# Altium integrated library CbyP.IntLib: 1144 symbols (part 6 of 6) (continued)
## FL7760BM6X (continued)

## HT7533-1
designator IC?
LDO high voltage regulator; Manufacturer: UMW; Mfr.Part #: HT7533-1; Package: SOT-89; LCSC Part #: C347186
footprint SOT-89
pins: 1 GND, 2 IN, 3 OUT

## IP2312-4V35
designator IC?, comment IP2312
Single-cell lithium battery synchronous switching step-down charging IC; Manufacturer: INJOINIC; Mfr.Part #: IP2312-4V35; Package: ESOP-8; LCSC Part #: C605433
footprint ESOP-8
pins: 1 D1, 2 TEST, 3 D2, 4 NTC, 5 BAT, 6 ICHG, 7 SW, 8 VIN, 9 GND

## IP2326
designator IC?, comment IP2366
2~3 1.5A VQFN-24-EP(4x4) Battery Management RoHS; Manufacturer: INJOINIC; Mfr.Part #: IP2326; Package: VQFN-24-EP(4x4); LCSC Part #: C2832094; DigiKey Part Number: NO
footprint QFN-24-EP(4x4)
pins: 1 DN, 2 DP, 3 VSET, 4 NTC, 5 BAT-STAT, 6 LED, 7 TIME-SET, 8 VIN-UVSET, 9 VIN-OVSET, 10 CON-SEL, 11 ISET, 12 EN, 13 VIN, 14 BST, 15 LX, 16 LX, 17 LX, 18 PGND, 19 VSYS, 20 VSYS, 21 VOUT, 22 VOUT, 23 VBATM, 24 VBATGND, 25 EP

## IP2366 (I2C version)
designator IC?, comment IP2366
QFN-40(5x5) Power Management - Specialized ROHS; Manufacturer: INJOINIC; Mfr.Part #: IP2366 (I2C version); So_Chan_Dan: 40; So_Chan_Cam: 0; Package: QFN-40(5x5); Name: IP2366
footprint QFN-40(5x5)
pins: 1 TEST2, 2 TEST3, 3 TEST4, 4 TEST5, 5 VBUS, 6 VBUSG, 7 VBUSI, 8 VIO, 9 CSP1, 10 CSN1, 11 PCIN, 12 HG1, 13 BST1, 14 LX1, 15 LG1, 16 LG2, 17 LX2, 18 BST2, 19 HG2, 20 PCON, 21 CSN2, 22 CSP2, 23 BAT, 24 CC_BDO, 25 VCC5V, 26 AGND, 27 GPIO4, 28 VCCIO, 29 GPIO3, 30 GPIO2, 31 GPIO1, 32 GPIO0, 33 EN, 34 CC2, 35 DPC, 36 DMC, 37 CC1, 38 GPIO19, 39 GPIO20, 40 TEST1, 41 GND

## IP2368_BZ_VGLIP
designator IC?, comment IP2368
Power management chip that supports multiple fast charging input and output protocols, multiple series-connected battery cells, and integrates step-up/step-down drivers.; Manufacturer: INJOINIC; Mfr.Part #: IP2368_BZ_VGLIP; Package: QFN-48(7x7); LCSC Part #: C5203723; DigiKey Part Number: NO; ComponentLink1Description: Link; ComponentLink1URL: https://www.lcsc.com/product-detail/C5203723.html?s_z=n_IP2368&spm=wm.ssy.bg.0.xh&lcsc_vid=RlMKBl1fQlJdAlBTQgUIUgUHQFUPBlJQFlJXVl0AT1cxVlNRQ1NdX1VXQFVaVjsOAxUeFF5JWBYZEEoKFBINSQcJGk4%3D; ComponentLink2Description: Link 1
footprint QFN-48-EP(7x7)-(IP2326)
pins: 1 NC, 2 LT, 3 NC, 4 LED3/I2C_INT, 5 HLED, 6 NC, 7 NC, 8 VBUS, 9 VBUSG, 10 VBUS_I, 11 AGND, 12 VIO, 13 CSP1, 14 CSN1, 15 PCIN, 16 HG1, 17 BST1, 18 LX1, 19 LG1, 20 LG2, 21 LX2, 22 BST2, 23 HG2, 24 PCON, 25 CSN2, 26 CSP2, 27 BAT, 28 LX, 29 VCC5V, 30 AGND, 31 NC, 32 VCCIO, 33 BAT_NUM, 34 FCAP, 35 VSET, 36 ISET, 37 NTC, 38 CC2, 39 DPC, 40 DMC, 41 CC1, 42 LED2/IIC_SDA, 43 LED1/IIC_SCL, 44 NC, 45 NC, 46 BAT_MODE, 47 ISET_MODE, 48 NC, 49 EPAD

## L7805ABD2T-TR
designator IC?
68dB@(120Hz) 1.5A Fixed 5V Positive electrode 35V TO-263-2 Voltage Regulators - Linear, Low Drop Out (LDO) Regulators ROHS; Manufacturer: STMicroelectronics; So_Chan_Dan: 3; So_Chan_Cam: 0; Mfr.Part #: L7805ABD2T-TR; Package: TO-263; Name: L7805ABD2T-TR
footprint TO-263
pins: 1 IN, 2 GND, 3 OUT

## L7805CV
designator IC?
Positive Voltage Regulator IC; Manufacturer: ST; Mfr.Part #: L7805CV; Package: TO-220; LCSC Part #: C111887
footprint TO-220
pins: 1 IN, 2 GND, 3 OUT

## LM1084ISX-3.3/NOPB
designator IC?
Linear Voltage Regulator IC Positive Fixed 1 Output 5A TO-263-3; Manufacturer: TI; Mfr.Part #: LM1084ISX-3.3/NOPB; Package: TO-263-3; LCSC Part #: C2860175; DigiKey Part Number: 296-35390-2-ND; ComponentLink1Description: Link 1; ComponentLink1URL: https://www.digikey.com/en/products/detail/texas-instruments/LM1084ISX-3-3-NOPB/366706; ComponentLink2Description: Link; ComponentLink2URL: https://www.lcsc.com/product-detail/C2860175.html?s_z=n_LM1084ISX-3.3%252FNOPB
footprint TO-263-3
pins: 1 ADJ/GND, 2 OUT, 3 VIN

## LM1084R-3.3
designator IC?
12V Positive Fixed 3.3V TO-263-3 Voltage Regulators - Linear, Low Drop Out (LDO) Regulators RoHS; Manufacturer: HTC; Mfr.Part #: LM1084R-3.3; Package: TO-263-3; LCSC Part #: C262795; DigiKey Part Number: NO; ComponentLink1Description: Link 1; ComponentLink1URL: https://www.lcsc.com/product-detail/C262795.html?s_z=n_lm1084
footprint TO-263-3
pins: 1 ADJ/GND, 2 OUT, 3 VIN

## LM1117MP-3.3/NOPB
designator IC?, comment LM1117
75dB@(120Hz) 800mA Fixed 3.3V Positive electrode 15V SOT-223-4 Voltage Regulators - Linear, Low Drop Out (LDO) Regulators ROHS; Manufacturer: Texas Instruments; Mfr.Part #: LM1117MP-3.3/NOPB; Package: SOT-223-4; LCSC Part #: C2860766
footprint SOT-223
pins: 1 ADJ/GND, 2 OUT, 3 VIN, 4 OUT

## LM2576S-5.0
designator IC?
47kHz~58kHz Buck Adjustable 3.5A 5V TO-263-5L Voltage Regulators - DC DC Switching Regulators RoHS; Manufacturer: HXY MOSFET; Mfr.Part #: LM2576S-5.0; Package: TO-263-5L; LCSC Part #: C5349983; DigiKey Part Number: NO; ComponentLink1Description: Link; ComponentLink1URL: https://www.lcsc.com/product-detail/C5349983.html?s_z=n_LM2576S-5.0; ComponentLink2Description: Link 1
footprint TO-263-5L
pins: 1 VIN, 2 VOUT, 3 GND, 4 FB, 5 ON/OFF

## LM2576S-5.0 TWGMC
designator IC?, comment LM2576S-5.0
Step-down type Fixed 5V 40V~57V TO-263-5 DC-DC Converters ROHS; Manufacturer: TWGMC; Mfr.Part #: LM2576S-5.0; Package: TO-263-5
footprint TO-263-5L
pins: 1 VIN, 2 VOUT, 3 GND, 4 FB, 5 ~{ON}/OFF

## LM2576S-12
designator IC?
Buck Switching Regulator IC Fixed 12V 1 Output 3A TO-263-5L; Manufacturer: HXY MOSFET; Mfr.Part #: LM2576S-12; Package: TO-263-5L; LCSC Part #: C22386541; DigiKey Part Number: NO; ComponentLink1Description: Link; ComponentLink1URL: https://www.lcsc.com/product-detail/C22386541.html?s_z=n_C22386541; ComponentLink2Description: Link 1
footprint TO-263-5L
pins: 1 VIN, 2 VOUT, 3 GND, 4 FB, 5 ON/OFF

## LM2842YMKX-ADJL/NOPB
designator IC?, comment LM2842
Step-down type 600mA 765mV~34V 4.5V~42V TSOT-23-6L DC-DC Converters ROHS; Manufacturer: Texas Instruments; Mfr.Part #: LM2842YMKX-ADJL/NOPB; Package: TSOT-23-6L; LCSC Part #: C545233
footprint SOT23-6
pins: 1 CB, 2 GND, 3 FB, 4 ~{SHDN}, 5 VIN, 6 SW

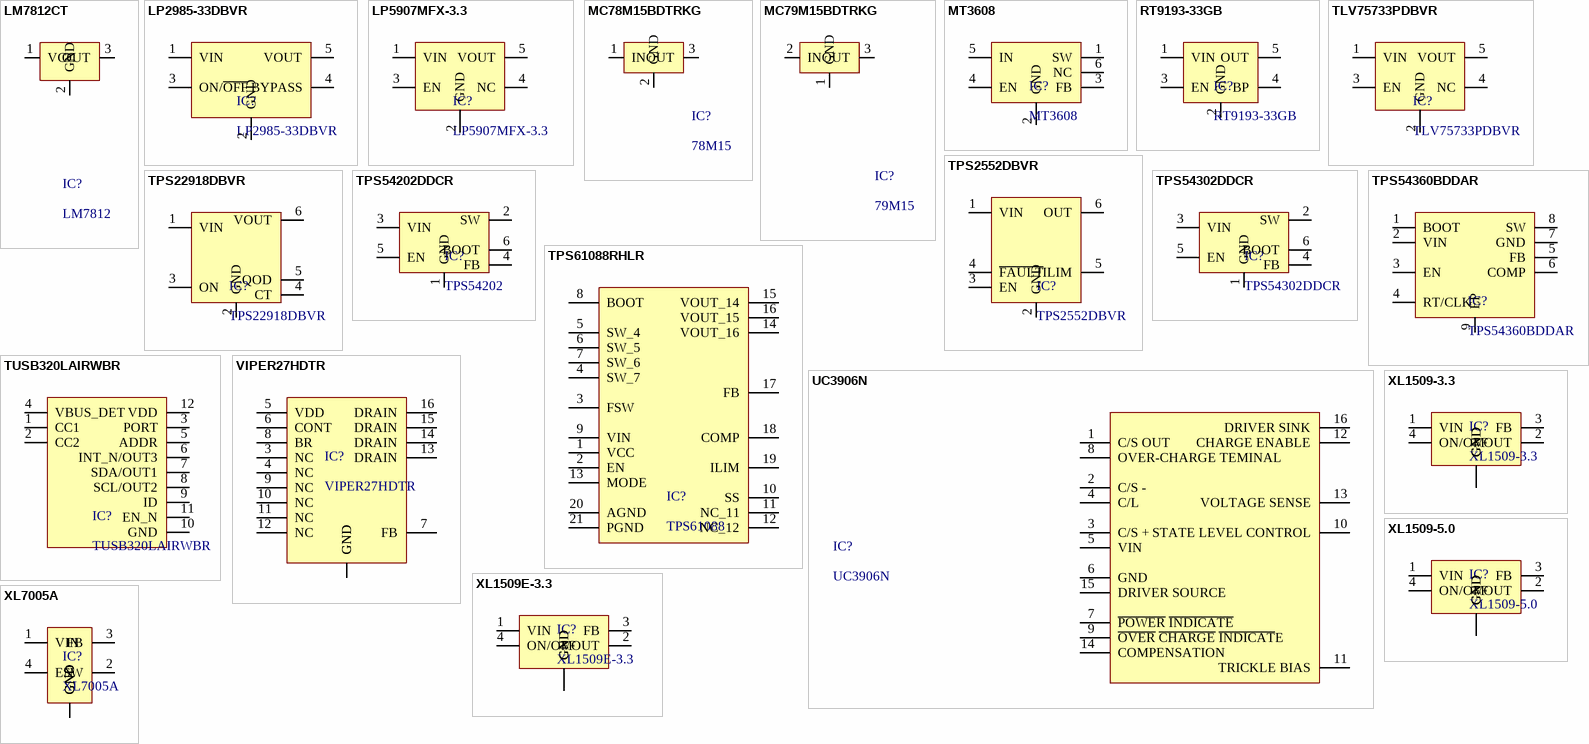
[diagram p39: symbols LM7812CT to XL7005A]

## LM7812CT
designator IC?, comment LM7812
Three-Terminal Fixed Positive Voltage Regulator; Manufacturer: HGSEMI; Mfr.Part #: LM7812CT; LCSC Part #: C7432223; Package: TO-220-3
footprint TO-220
pins: 1 VCC, 2 GND, 3 OUT

## LP2985-33DBVR
designator IC?
45dB@(1kHz) 150mA Fixed 3.3V Positive electrode 16V SOT-23-5 Voltage Regulators - Linear, Low Drop Out (LDO) Regulators ROHS; Manufacturer: Texas Instruments; So_Chan_Dan: 5; So_Chan_Cam: 0; Mfr.Part #: LP2985-33DBVR; Package: SOT-23-5; Name: LP2985-33DBVR
footprint SOT23-5
pins: 1 VIN, 2 GND, 3 ON/~{OFF}, 4 BYPASS, 5 VOUT

## LP5907MFX-3.3
designator IC?
75dB@(1kHz) Positive Fixed 3.3V SOT-23-5 Voltage Regulators - Linear, Low Drop Out (LDO) Regulators ROHS; Manufacturer: TECH PUBLIC; Mfr.Part #: LP5907MFX-3.3; Package: SOT-23-5; LCSC Part #: C23380874; DigiKey Part Number: 296-38557-2-ND
footprint SOT23-5
pins: 1 VIN, 2 GND, 3 EN, 4 NC, 5 VOUT

## MC78M15BDTRKG
designator IC?, comment 78M15
15V 30V Positive Fixed DPAK-3 Voltage Regulators - Linear, Low Drop Out (LDO) Regulators RoHS; Manufacturer: onsemi; Mfr.Part #: MC78M15BDTRKG; LCSC Part #: C127442; DigiKey Part Number: MC78M15BDTRKGOSTR-ND; ComponentLink1Description: Link; ComponentLink1URL: https://www.lcsc.com/product-detail/C127442.html?s_z=n_78M15; Package: DPAK-3; ComponentLink2Description: Link 1; ComponentLink2URL: https://www.digikey.com/en/products/detail/onsemi/MC78M15BDTRKG/1481485?s=N4IgTCBcDaILIGEDsAOOBGArAIQCIBUAlAaQHEQBdAXyA
footprint TO-252
pins: 1 IN, 2 GND, 3 OUT

## MC79M15BDTRKG
designator IC?, comment 79M15
15V 30V Negative Fixed TO-252(DPAK) Voltage Regulators - Linear, Low Drop Out (LDO) Regulators RoHS; Manufacturer: onsemi; Mfr.Part #: MC79M15BDTRKG; LCSC Part #: C179584; DigiKey Part Number: MC79M15BDTRKGOSTR-ND; ComponentLink1Description: Link; ComponentLink1URL: https://www.lcsc.com/product-detail/C179584.html?s_z=n_79M15; Package: TO-252(DPAK); ComponentLink2Description: Link 1; ComponentLink2URL: https://www.digikey.com/en/products/detail/onsemi/MC79M15BDTRKG/1481635?s=N4IgTCBcDaILIGEDsBOOBGArAIQCIBUAlAaQHEQBdAXyA
footprint TO-252
pins: 1 GND, 2 IN, 3 OUT

## MT3608
designator IC?
1.2MHz Boost Adjustable 600mV~28V 2A SOT-23-6 Voltage Regulators - DC DC Switching Regulators RoHS; Manufacturer: XI'AN Aerosemi Tech; Package: SOT-23-6; LCSC Part #: C84817; Mfr.Part #: MT3608; DigiKey Part Number: NO
footprint SOT23-6
pins: 1 SW, 2 GND, 3 FB (power), 4 EN (power), 5 IN (power), 6 NC

## RT9193-33GB
designator IC?
-50dB@(10kHz) Positive Fixed 3.3V SOT-23-5 Voltage Regulators - Linear, Low Drop Out (LDO) Regulators RoHS; Manufacturer: RICHTEK; Mfr.Part #: RT9193-33GB; Package: SOT-23-5; LCSC Part #: C15651; DigiKey Part Number: 1028-1014-2-ND
footprint SOT23-5
pins: 1 VIN, 2 GND, 3 EN, 4 BP, 5 OUT

## TLV75733PDBVR
designator IC?
3.3V Positive Fixed SOT-23-5 Voltage Regulators - Linear, Low Drop Out (LDO) Regulators RoHS; Manufacturer: TI; Mfr.Part #: TLV75733PDBVR; Package: SOT-23-5; LCSC Part #: C485517; DigiKey Part Number: 296-50414-2-ND
footprint SOT23-5
pins: 1 VIN, 2 GND, 3 EN, 4 NC, 5 VOUT

## TPS2552DBVR
designator IC?
2.5V~6.5V 1 Active Low 1.5A High Side Switch SOT-23-6 Power Distribution Switches, Load Drivers RoHS; Manufacturer: TI; Mfr.Part #: TPS2552DBVR; Package: SOT-23-6; LCSC Part #: C46506; DigiKey Part Number: 296-37894-2-ND; ComponentLink1Description: Link; ComponentLink1URL: https://www.lcsc.com/product-detail/C46506.html?s_z=n_TPS2552; ComponentLink2Description: Link 1; ComponentLink2URL: https://www.digikey.com/en/products/detail/texas-instruments/TPS2552DBVR/2047892
footprint SOT23-6
pins: 1 VIN, 2 GND, 3 EN, 4 ~{FAULT}, 5 ILIM, 6 OUT

## TPS22918DBVR
designator IC?
1V~5.5V 1 Active High 2A Load Switch SOT-23-6 Power Distribution Switches, Load Drivers RoHS; Manufacturer: TI; Mfr.Part #: TPS22918DBVR; Package: SOT-23-6; LCSC Part #: C131941; DigiKey Part Number: 296-TPS54202DDCRTR-ND; ComponentLink1Description: Link; ComponentLink1URL: https://www.lcsc.com/product-detail/C131941.html?s_z=n_TPS22918; ComponentLink2Description: Link 1; ComponentLink2URL: https://www.digikey.com/en/products/detail/texas-instruments/TPS22918DBVR/5994601?s=N4IgTCBcDaICoAUDKYwE4CMAOAIgIQDUAlEAXQF8g
footprint SOT23-6
pins: 1 VIN, 2 GND, 3 ON, 4 CT, 5 QOD, 6 VOUT

## TPS54202DDCR
designator IC?, comment TPS54202
Step-down type 600mA 765mV~34V 4.5V~42V TSOT-23-6L DC-DC Converters ROHS; Manufacturer: TI; Mfr.Part #: TPS54202DDCR; Package: SOT-23-6; LCSC Part #: C191884; DigiKey Part Number: 296-TPS54202DDCRTR-ND
footprint SOT23-6
pins: 1 GND, 2 SW, 3 VIN, 4 FB, 5 EN, 6 BOOT

## TPS54302DDCR
designator IC?
4.5-V to 28-V Input, 3-A Output, EMI-Friendly Synchronous Step-Down Converter; Manufacturer: TI; Mfr.Part #: TPS54302DDCR; Package: TSOT-23-6; LCSC Part #: C311983; DigiKey Part Number: 296-46237-2-ND; ComponentLink1Description: Link; ComponentLink1URL: https://www.lcsc.com/product-detail/C311983.html?s_z=n_TPS5430; ComponentLink2Description: Link 1; ComponentLink2URL: https://www.digikey.com/en/products/detail/texas-instruments/TPS54302DDCR/6572466?s=N4IgTCBcDa4JwDYC0AWBYDMB2JYkDkAREAXQF8g
footprint SOT23-6
footprint TSOT-23-6
pins: 1 GND, 2 SW, 3 VIN, 4 FB, 5 EN, 6 BOOT

## TPS54360BDDAR
designator IC?
2.5MHz Buck Adjustable 800mV~58.8V 3.5A SOIC-8-EP Voltage Regulators - DC DC Switching Regulators RoHS; Manufacturer: TI; Mfr.Part #: TPS54360BDDAR; Package: SOIC-8-EP; LCSC Part #: C524806; DigiKey Part Number: 296-TPS54360BDDARTR-ND; ComponentLink1Description: Link; ComponentLink1URL: https://www.lcsc.com/product-detail/C524806.html?s_z=n_TPS54360; ComponentLink2Description: Link 1; ComponentLink2URL: https://www.digikey.com/en/products/detail/texas-instruments/TPS54360BDDAR/10434703?s=N4IgTCBcDaICoAUDKBWALAZgGwAYBCAIgQIIBKIAugL5A
footprint ESOP-8
pins: 1 BOOT, 2 VIN, 3 EN, 4 RT/CLK, 5 FB, 6 COMP, 7 GND, 8 SW, 9 EP

## TPS61088RHLR
designator IC?, comment TPS61088
Boost Switching Regulator IC Adjustable 4.5V~12.6V 1 Output 10A VQFN-20-EP(3.6x4.6); Mfr.Part #: TPS61088RHLR; Manufacturer: TI; LCSC Part #: C87357; Package: VQFN-20-EP(3.6x4.6)
footprint VQFN-20-EP(3.6x4.6)
pins: 1 VCC, 2 EN, 3 FSW, 4 SW_7, 5 SW_4, 6 SW_5, 7 SW_6, 8 BOOT, 9 VIN, 10 SS, 11 NC_11, 12 NC_12, 13 MODE, 14 VOUT_16, 15 VOUT_14, 16 VOUT_15, 17 FB, 18 COMP, 19 ILIM, 20 AGND, 21 PGND

## TUSB320LAIRWBR
designator IC?
I2C -40℃~+85℃ 3A X2-QFN-12(1.6x1.6) Specialized RoHS; Manufacturer: TI; Mfr.Part #: TPS22918DBVR; Package: X2-QFN-12(1.6x1.6); LCSC Part #: C132554; DigiKey Part Number: 296-TUSB320LAIRWBRTR-ND; ComponentLink1Description: Link; ComponentLink1URL: https://www.lcsc.com/product-detail/C132554.html?s_z=n_TUSB320LAIRWBR; ComponentLink2Description: Link 1; ComponentLink2URL: https://www.digikey.com/en/products/detail/texas-instruments/TUSB320LAIRWBR/5722618?s=N4IgTCBcDaICoFUDKAhAzGADAGQIIEkAlAdRUJAF0BfIA
footprint 12-X2QFN (1.6x1.6)
pins: 1 CC1, 2 CC2, 3 PORT, 4 VBUS_DET, 5 ADDR, 6 INT_N/OUT3, 7 SDA/OUT1, 8 SCL/OUT2, 9 ID, 10 GND, 11 EN_N, 12 VDD

## UC3906N
designator IC?
Sealed Lead-Acid Battery Charger; Manufacturer: TI; Package: PDIP-16; LCSC Part #: C3682377; Mfr.Part #: UC3906N
footprint DIP-16
pins: 1 C/S OUT, 2 C/S -, 3 C/S +, 4 C/L, 5 VIN, 6 GND, 7 ~{POWER} ~{INDICATE}, 8 OVER-CHARGE TEMINAL, 9 ~{OVER} ~{CHARGE} ~{INDICAT}E, 10 STATE LEVEL CONTROL, 11 TRICKLE BIAS, 12 CHARGE ENABLE, 13 VOLTAGE SENSE, 14 COMPENSATION, 15 DRIVER SOURCE, 16 DRIVER SINK

## VIPER27HDTR
designator IC?
Off-line high voltage converters; Manufacturer: ST; Mfr.Part #: VIPER27HDTR; Package: SOIC-16; LCSC Part #: C2969919
footprint SOIC-16
pins: 1 GND, 2 GND, 3 NC, 4 NC, 5 VDD, 6 CONT, 7 FB, 8 BR, 9 NC, 10 NC, 11 NC, 12 NC, 13 DRAIN, 14 DRAIN, 15 DRAIN, 16 DRAIN

## XL1509-3.3
designator IC?
Step-down type Fixed 2A 3.3V 4.5V~40V SOP-8 DC-DC Converters ROHS; Manufacturer: UMW(Youtai Semiconductor Co., Ltd.); So_Chan_Dan: 9; So_Chan_Cam: 0; Mfr.Part #: XL1509-3.3; Package: SOP-8; Name: XL1509-3.3
footprint SOIC-8
pins: 1 VIN, 2 VOUT, 3 FB, 4 ON/OFF, 5 GND, 6 GND, 7 GND, 8 GND

## XL1509-5.0
designator IC?
Step-down type Fixed 5V 2A 4.5V~40V SOIC-8 DC-DC Converters ROHS; Manufacturer: UMW(Youtai Semiconductor Co., Ltd.); So_Chan_Dan: 9; So_Chan_Cam: 0; Mfr.Part #: XL1509-5.0; Package: SOP-8; Name: XL1509-5.0
footprint SOIC-8
pins: 1 VIN, 2 VOUT, 3 FB, 4 ON/OFF, 5 GND, 6 GND, 7 GND, 8 GND

## XL1509E-3.3
designator IC?
Step-down type Fixed 3.3V 2A 4.5V~40V ESOP-8 DC-DC Converters ROHS; Manufacturer: UMW(Youtai Semiconductor Co., Ltd.); So_Chan_Dan: 7; So_Chan_Cam: 0; Mfr.Part #: XL1509E-3.3; Package: ESOP-8; Name: XL1509E-3.3
footprint ESOP-8
pins: 1 VIN, 2 VOUT, 3 FB, 4 ON/OFF, 5 GND, 6 GND, 7 GND, 8 GND

## XL7005A
designator IC?
150kHz Step-down type Adjustable 1.25V~20V 400mA SOIC-8-EP Voltage Regulators - DC DC Switching Regulators RoHS; Manufacturer: XLSEMI; Mfr.Part #: XL7005A; Package: SOIC-8-EP; LCSC Part #: C50848
footprint ESOP-8
pins: 1 VIN, 2 SW, 3 FB, 4 EN, 5 GND, 6 GND, 7 GND, 8 GND, 9 GND


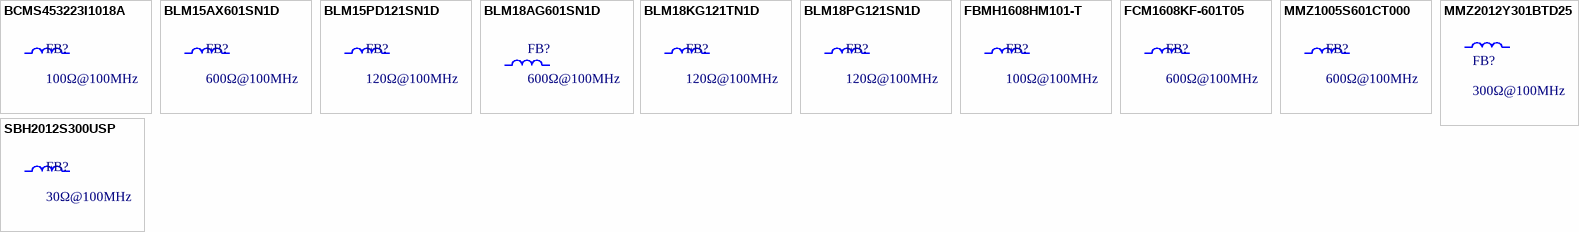
[diagram p40: symbols BCMS453223I1018A to SBH2012S300USP]

## BCMS453223I1018A
designator FB?, comment 100Ω@100MHz
100Ω@100MHz Ferrite Bead 1812 8A 7mΩ; Manufacturer: HYHONGYEX; Mfr.Part #: BCMS453223I1018A; Package: 1812; LCSC Part #: C3025586; DigiKey Part Number: 5262-BCMS453223I1018ATR-ND; ComponentLink1Description: Link; ComponentLink1URL: https://www.lcsc.com/product-detail/C3025586.html?s_z=n_q_C3025586; ComponentLink2Description: Link 1; ComponentLink2URL: https://www.digikey.com/en/products/detail/max-echo/BCMS453223I101-8A/22486072?s=N4IgTCBcDaIEIGECyBlALAVgMxjFgkgIwAMhAHAIIgC6AvkA
footprint FB-1812
pins: 1, 2

## BLM15AX601SN1D
designator FB?, comment 600Ω@100MHz
FERRITE BEAD 600Ω 0402 1LN; Manufacturer: muRata; Mfr.Part #: BLM15AX601SN1D; Package: 0402; LCSC Part #: C76886
footprint FB-0402
pins: 1, 2

## BLM15PD121SN1D
designator FB?, comment 120Ω@100MHz
90mΩ ±25% 120Ω@100MHz 0402 Ferrite Beads ROHS; Manufacturer: muRata; Mfr.Part #: BLM15PD121SN1D; Package: 0402; LCSC Part #: C76891; DigiKey Part Number: 490-5203-2-ND
footprint FB-0402
pins: 1, 2

## BLM18AG601SN1D
designator FB?, comment 600Ω@100MHz
600Ω@100MHz 1 Line Ferrite Bead 0603 500mA 380mΩ; Manufacturer: muRata; Mfr.Part #: BLM18AG601SN1D; Package: 0603; LCSC Part #: C85831; DigiKey Part Number: 490-1014-2-ND; ComponentLink1Description: Link; ComponentLink1URL: https://www.lcsc.com/product-detail/C19330.html; ComponentLink2Description: Link 1; ComponentLink2URL: https://www.digikey.com/en/products/detail/murata-electronics/BLM18AG601SN1D/584225?s=N4IgTCBcDaIEIBkCyBGAHAQQOIDYAMKAygHIoAiIAugL5A
footprint FB-0603
pins: 1, 2

## BLM18KG121TN1D
designator FB?, comment 120Ω@100MHz
120Ω@100MHz 1 Line Ferrite Bead 0603 3A 30mΩ; Manufacturer: muRata; Mfr.Part #: BLM18KG121TN1D; Package: 0603; LCSC Part #: C85831; DigiKey Part Number: 490-5254-1-ND; ComponentLink1Description: Link; ComponentLink1URL: https://www.lcsc.com/product-detail/C85831.html?s_z=n_C85831; ComponentLink2Description: Link 1; ComponentLink2URL: https://www.digikey.com/en/products/detail/murata-electronics/BLM18KG121TN1D/1982762?s=N4IgTCBcDaICwE4AMBaArGNcUEYUDkAREAXQF8g
footprint FB-0603
pins: 1, 2

## BLM18PG121SN1D
designator FB?, comment 120Ω@100MHz
120Ω@100MHz 1 Line Ferrite Bead 0603 2A 50mΩ; Manufacturer: muRata; Mfr.Part #: BLM18PG121SN1D; Package: 0603; LCSC Part #: C14709; DigiKey Part Number: 490-1037-2-ND; ComponentLink1Description: Link; ComponentLink1URL: https://www.lcsc.com/product-detail/C14709.html?s_z=n_ferrite; ComponentLink2Description: Link 1; ComponentLink2URL: https://www.digikey.com/en/products/detail/murata-electronics/BLM18PG121SN1D/584248?s=N4IgTCBcDaIEIBkCyBGAHABQOIrCgygHIoAiIAugL5A
footprint FB-0603
pins: 1, 2

## FBMH1608HM101-T
designator FB?, comment 100Ω@100MHz
20mΩ ±25% 100Ω@100MHz 0603 Ferrite Beads ROHS; Manufacturer: Taiyo Yuden; Mfr.Part #: FBMH1608HM101-T; Package: 0603; LCSC Part #: C515366
footprint FB-0603
pins: 1, 2

## FCM1608KF-601T05
designator FB?, comment 600Ω@100MHz
500mΩ ±25% 600Ω@100MHz 0603 Ferrite Beads ROHS; Manufacturer: TAI-TECH; Mfr.Part #: FCM1608KF-601T05; Package: 0603; LCSC Part #: C133937
footprint FB-0603
pins: 1, 2

## MMZ1005S601CT000
designator FB?, comment 600Ω@100MHz
520mΩ ±25% 600Ω@100MHz 0402 Ferrite Beads and Chips ROHS; Manufacturer: TDK; Mfr.Part #: MMZ1005S601CT000; Package: 0402; LCSC Part #: C76804
footprint FB-0402
pins: 1, 2

## MMZ2012Y301BTD25
designator FB?, comment 300Ω@100MHz
150mΩ ±25% 300Ω@100MHz 0805 Ferrite Beads ROHS; Manufacturer: TDK; Mfr.Part #: MMZ2012Y301BTD25; Package: 0805; LCSC Part #: C2661775; DigiKey Part Number: 445-MMZ2012Y301BTD25TR-ND
footprint FB-0805
footprint CAP-0805-1
pins: 1, 2

## SBH2012S300USP
designator FB?, comment 30Ω@100MHz
30mΩ ±25% 30Ω@100MHz 0805 Ferrite Beads and Chips ROHS; Manufacturer: Sunltech; Mfr.Part #: SBH2012S300USP; Package: 0805; LCSC Part #: C216148
footprint FB-0805
pins: 1, 2


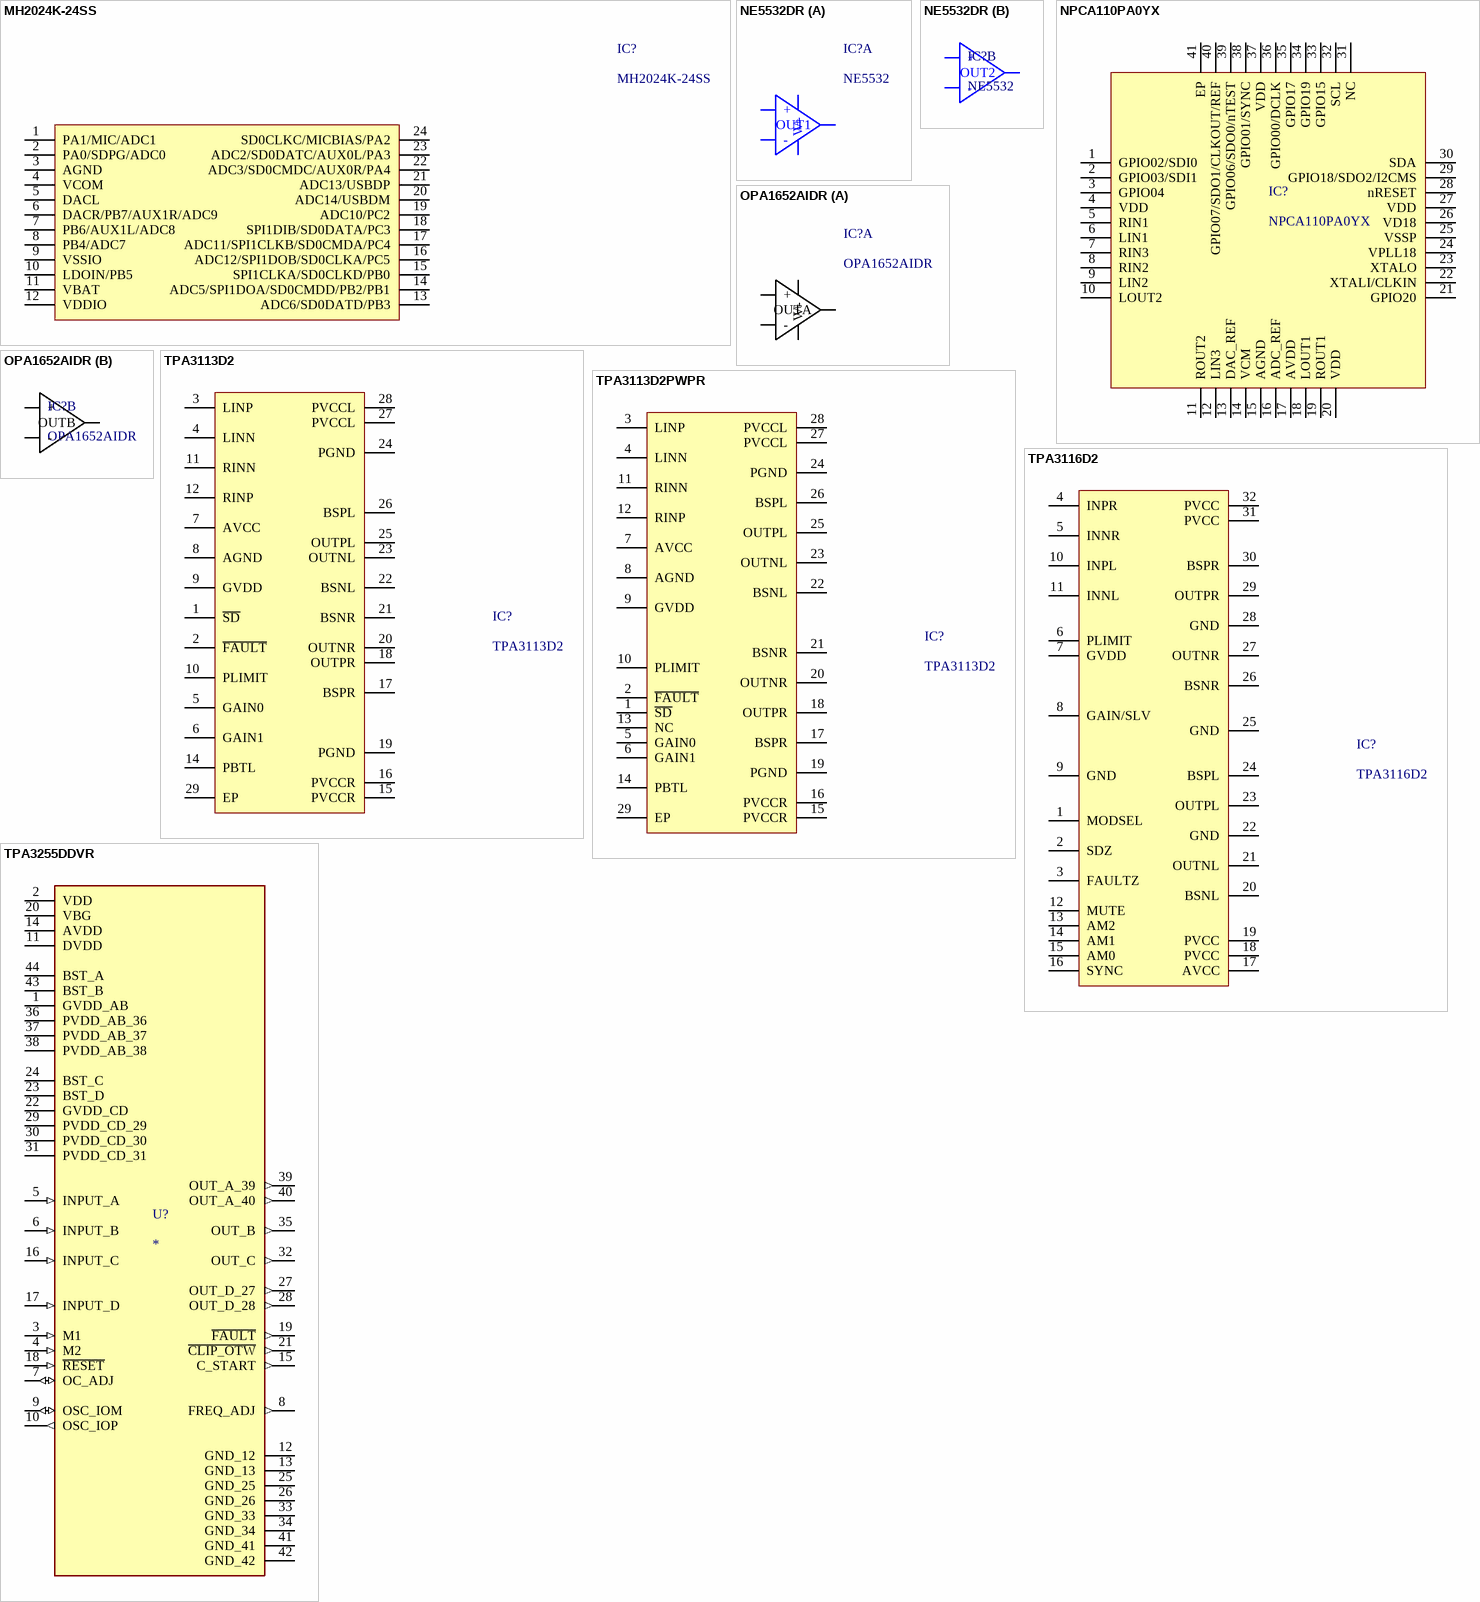
[diagram p41: symbols MH2024K-24SS to TPA3255DDVR]

## MH2024K-24SS
designator IC?
Compact MP3/WAV/WMA audio decoder module with built-in amplifier and TF/USB support for embedded systems and microcontroller projects.; Manufacturer: GD; Package: QSOP24
footprint QSOP-24
pins: 1 PA1/MIC/ADC1 , 2 PA0/SDPG/ADC0, 3 AGND, 4 VCOM, 5 DACL, 6 DACR/PB7/AUX1R/ADC9, 7 PB6/AUX1L/ADC8, 8 PB4/ADC7, 9 VSSIO, 10 LDOIN/PB5, 11 VBAT, 12 VDDIO, 13 ADC6/SD0DATD/PB3, 14 ADC5/SPI1DOA/SD0CMDD/PB2/PB1, 15 SPI1CLKA/SD0CLKD/PB0, 16 ADC12/SPI1DOB/SD0CLKA/PC5, 17 ADC11/SPI1CLKB/SD0CMDA/PC4, 18 SPI1DIB/SD0DATA/PC3, 19 ADC10/PC2, 20 ADC14/USBDM, 21 ADC13/USBDP, 22 ADC3/SD0CMDC/AUX0R/PA4, 23 ADC2/SD0DATC/AUX0L/PA3, 24 SD0CLKC/MICBIAS/PA2

## NE5532DR
designator IC?, comment NE5532
500uV 1uA 9V/us 100dB 16mA 10MHz 2 SOIC-8 Amplifiers RoHS; Manufacturer: TI; Mfr.Part #: NE5532DR; Package: SOIC-8; LCSC Part #: C7426; DigiKey Part Number: 296-13622-2-ND; ComponentLink1Description: Link; ComponentLink1URL: https://www.lcsc.com/product-detail/C7426.html?s_z=n_NE5532; ComponentLink2Description: Link 1; ComponentLink2URL: https://www.digikey.com/en/products/detail/texas-instruments/NE5532DR/499499
footprint SOIC-8
part A pins: 1 OUT1, 2 -, 3 +, 4 V- (power), 8 V+ (power)
part B pins: 5 +, 6 -, 7 OUT2

## NPCA110PA0YX
designator IC?
QFN-40-EP(6x6) Audio Amplifiers ROHS; Manufacturer: Nuvoton Tech; So_Chan_Dan: 41; So_Chan_Cam: 0; Mfr.Part #: NPCA110PA0YX; Package: QFN-40-EP(6x6); Name: NPCA110PA0YX
footprint QFN-40-EP(6x6)
pins: 1 GPIO02/SDI0, 2 GPIO03/SDI1, 3 GPIO04, 4 VDD, 5 RIN1, 6 LIN1, 7 RIN3, 8 RIN2, 9 LIN2, 10 LOUT2, 11 ROUT2, 12 LIN3, 13 DAC_REF, 14 VCM, 15 AGND, 16 ADC_REF, 17 AVDD, 18 LOUT1, 19 ROUT1, 20 VDD, 21 GPIO20, 22 XTALI/CLKIN, 23 XTALO, 24 VPLL18, 25 VSSP, 26 VD18, 27 VDD, 28 nRESET, 29 GPIO18/SDO2/I2CMS, 30 SDA, 31 NC, 32 SCL, 33 GPIO15, 34 GPIO19, 35 GPIO17, 36 GPIO00/DCLK, 37 VDD, 38 GPIO01/SYNC, 39 GPIO06/SDO0/nTEST, 40 GPIO07/SDO1/CLKOUT/REF, 41 EP

## OPA1652AIDR
designator IC?
2mA 2-Channel SOIC-8 Audio Amplifiers ROHS; Manufacturer: TI; Package: SOIC-8; Mfr.Part #: OPA1652AIDR; LCSC Part #: C30025
footprint SOIC-8
part A pins: 1 OUTA, 2 -, 3 +, 4 V- (power), 8 V+ (power)
part B pins: 5 +, 6 -, 7 OUTB

## TPA3113D2
designator IC?
Dual Channel 6Wx2@8Ω Class D Amplifier HTSSOP-28-EP-4.5mm Audio Amplifiers ROHS; Manufacturer: Texas Instruments; Mfr.Part #: TPA3113D2PWPR; Package: HTSSOP-28-EP-4.5mm; LCSC Part #: C128608
footprint HTSSOP-32-EP-6.1mm-TPA3116D2
pins: 1 ~{SD}, 2 ~{FAULT}, 3 LINP, 4 LINN, 5 GAIN0, 6 GAIN1, 7 AVCC, 8 AGND, 9 GVDD, 10 PLIMIT, 11 RINN, 12 RINP, 14 PBTL, 15 PVCCR, 16 PVCCR, 17 BSPR, 18 OUTPR, 19 PGND, 20 OUTNR, 21 BSNR, 22 BSNL, 23 OUTNL, 24 PGND, 25 OUTPL, 26 BSPL, 27 PVCCL, 28 PVCCL, 29 EP

## TPA3113D2PWPR
designator IC?, comment TPA3113D2
Dual Channel 6Wx2@8Ω Class D Amplifier HTSSOP-28-EP-4.5mm Audio Amplifiers ROHS; Manufacturer: Texas Instruments; Mfr.Part #: TPA3113D2PWPR; Package: HTSSOP-28; LCSC Part #: C128608; DigiKey Part Number: 296-25122-2-ND
footprint HTSSOP-28
pins: 1 ~{SD}, 2 ~{FAULT}, 3 LINP, 4 LINN, 5 GAIN0, 6 GAIN1, 7 AVCC, 8 AGND, 9 GVDD, 10 PLIMIT, 11 RINN, 12 RINP, 13 NC, 14 PBTL, 15 PVCCR, 16 PVCCR, 17 BSPR, 18 OUTPR, 19 PGND, 20 OUTNR, 21 BSNR, 22 BSNL, 23 OUTNL, 24 PGND, 25 OUTPL, 26 BSPL, 27 PVCCL, 28 PVCCL, 29 EP

## TPA3116D2
designator IC?
20mA 2-Channel 50Wx2@4Ω Class D HTSSOP-32-6.1mm Audio Amplifiers ROHS; Manufacturer: Texas Instruments; Mfr.Part #: TPA3116D2DADR; Package: HTSSOP-32-6.1mm; LCSC Part #: C50144
footprint HTSSOP-32-EP-6.1mm-TPA3116D2
pins: 1 MODSEL, 2 SDZ, 3 FAULTZ, 4 INPR, 5 INNR, 6 PLIMIT, 7 GVDD, 8 GAIN/SLV, 9 GND, 10 INPL, 11 INNL, 12 MUTE, 13 AM2, 14 AM1, 15 AM0, 16 SYNC, 17 AVCC, 18 PVCC, 19 PVCC, 20 BSNL, 21 OUTNL, 22 GND, 23 OUTPL, 24 BSPL, 25 GND, 26 BSNR, 27 OUTNR, 28 GND, 29 OUTPR, 30 BSPR, 31 PVCC, 32 PVCC

## TPA3255DDVR
designator U?
315-W stereo, 600-W mono, 18- to 53.5-V supply, analog input Class-D audio amplifier 44-HTSSOP 0 to 70; MP: TPA3255DDVR; Package: None; Availability: Unavailable; Price: None; Value: *
footprint HTSSOP-44-6.1mm-TPA3255
pins: 1 GVDD_AB (power), 2 VDD (power), 3 M1 (in), 4 M2 (in), 5 INPUT_A (in), 6 INPUT_B (in), 7 OC_ADJ (io), 8 FREQ_ADJ (out), 9 OSC_IOM (io), 10 OSC_IOP (out), 11 DVDD (power), 12 GND_12 (power), 13 GND_13 (power), 14 AVDD (power), 15 C_START (out), 16 INPUT_C (in), 17 INPUT_D (in), 18 ~{RESET} (in), 19 ~{FAULT} (out), 20 VBG (power), 21 ~{CLIP_OTW} (out), 22 GVDD_CD (power), 23 BST_D (power), 24 BST_C (power), 25 GND_25 (power), 26 GND_26 (power), 27 OUT_D_27 (out), 28 OUT_D_28 (out), 29 PVDD_CD_29 (power), 30 PVDD_CD_30 (power), 31 PVDD_CD_31 (power), 32 OUT_C (out), 33 GND_33 (power), 34 GND_34 (power), 35 OUT_B (out), 36 PVDD_AB_36 (power), 37 PVDD_AB_37 (power), 38 PVDD_AB_38 (power), 39 OUT_A_39 (out), 40 OUT_A_40 (out), 41 GND_41 (power), 42 GND_42 (power), 43 BST_B (power), 44 BST_A (power)